# Altium schematic symbol library Analog Devices Operational Amplifiers.SchLib: 2102 symbols (part 7 of 35) (continued)
## AD8016ARBZ (continued)

## AD8016ARBZ-REEL
designator U?
Double Channel Low Power Operational Amplifier, 380 MHz BW, 1 KV/us SR, Industrial, 24-pin SOIC (RB-24), Reel; Generic Part Number: AD8016; Manufacturer: Analog Devices; PartNumber: AD8016ARBZ-REEL; Amplifiers Per Package: 2; Input Bias Current: 45uA; Input Offset Voltage: 1mV; Iq/Amp: 13.2mA; Slew Rate: 1KV/us; Small Signal Bandwidth: 380MHz; V Span Max: 26V; V Span Min: 6V; DatasheetVersion: 02-23-2012-A; PackageReference: RB-24; PackageDescription: 24-Pin Batwing SOIC, Thermally Enhanced with Fused Leads, Body 15.4 x 7.5 mm, Pitch 1.27 mm; Supplier 1: Digi-Key; Supplier Part Number 1: AD8016ARBZ-REEL-ND; Mounting Technology: Surface Mount; Code_JEDEC: MS-013-AD; ComponentLink1Description: Manufacturer URL; ComponentLink1URL: http://www.analog.com/en/index.html; ComponentLink2Description: Datasheet; ComponentLink2URL: http://www.analog.com/static/imported-files/data_sheets/AD8016.pdf; ComponentLink3Description: Package Specification; ComponentLink3URL: http://www.analog.com/static/imported-files/packages/479743993852630252966076RB_24.pdf
footprint ADI-RB-24_N (SOIC, 24-Leads, Body 15.4x7.5mm, Pitch 1.27mm, IPC Medium Density)
footprint ADI-RB-24_L (SOIC, 24-Leads, Body 15.4x7.5mm, Pitch 1.27mm, IPC High Density)
footprint ADI-RB-24_M (SOIC, 24-Leads, Body 15.4x7.5mm, Pitch 1.27mm, IPC Low Density)
pins: 1 +V1 (power) "Positive Power Supply, Amp 1.", 2 VOUT 1 (out) "Output Signal, Amp 1.", 3 VINN 1 (in) "Negative Input Signal, Amp 1.", 4 VINP 1 (in) "Positive Input Signal, Amp1.", 5 AGND (power) "Analog Ground.", 6 AGND (power) "Analog Ground.", 7 AGND (power) "Analog Ground.", 8 AGND (power) "Analog Ground.", 9 PWDN 0 (in) "Power-Down Input 0.", 10 DGND (power) "Digital Ground.", 11 -V1 (power) "Negative Power Supply, Amp1.", 12 NC "This pin is not connected internally", 13 NC "This pin is not connected internally", 14 -V2 (power) "-V Power Supply, Amp 2.", 15 BIAS (in) "Quiescent Current Adjust.", 16 PWDN 1 (in) "Power-Down Input 1.", 17 AGND (power) "Analog Ground.", 18 AGND (power) "Analog Ground.", 19 AGND (power) "Analog Ground.", 20 AGND (power) "Analog Ground.", 21 VINP 2 (in) "Positive Input Signal, Amp 2.", 22 VINN 2 (in) "Negative Input Signal, Amp 2.", 23 VOUT 2 (out) "Output Signal, Amp 2.", 24 +V2 (power) "Positive Power Supply, Amp 2."

## AD8017AR
designator U?
Double Channel Low Power Operational Amplifier, 160 MHz BW, 1.6 KV/us SR, Industrial, 8-pin SOIC (R-8), Tube; Generic Part Number: AD8017; Manufacturer: Analog Devices; PartNumber: AD8017AR; Amplifiers Per Package: 2; Input Bias Current: 160uA; Input Offset Voltage: 1.8mV; Iq/Amp: 7.7mA; Small Signal Bandwidth: 160MHz; V Span Max: 12V; V Span Min: 4.4V; DatasheetVersion: Rev. C; PackageVersion: 060506-A; PackageReference: R-8; PackageDescription: 8-Pin Standard Small Outline Package, Body 3.9 x 4.9 mm, Pitch 1.27 mm; Supplier 1: Digi-Key; Supplier Part Number 1: AD8017AR-ND; Slew Rate: 1.6KV/us; Mounting Technology: Surface Mount; Code_JEDEC: MS-012-AA; ComponentLink1Description: Manufacturer URL; ComponentLink1URL: http://www.analog.com/en/index.html; ComponentLink2Description: Datasheet; ComponentLink2URL: http://www.analog.com/static/imported-files/data_sheets/AD8017.pdf; ComponentLink3Description: Package Specification; ComponentLink3URL: http://www.analog.com/static/imported-files/packages/PKG_PDF/SOIC_Narrow%20(R)/R_8.pdf
footprint ADI-R-8_N (SOIC, 8-Leads, Body 4.9x3.9mm, Pitch 1.27mm, IPC Medium Density)
footprint ADI-R-8_L (SOIC, 8-Leads, Body 4.9x3.9mm, Pitch 1.27mm, IPC High Density)
footprint ADI-R-8_M (SOIC, 8-Leads, Body 4.9x3.9mm, Pitch 1.27mm, IPC Low Density)
pins on every part: 4 -VS (power), 8 +VS (power)
part A pins: 1 OUT 1 (out), 2 -IN 1 (in), 3 +IN 1 (in)
part B pins: 5 +IN 2 (in), 6 -IN 2 (in), 7 OUT 2 (out)

## AD8017AR-REEL
designator U?
Double Channel Low Power Operational Amplifier, 160 MHz BW, 1.6 KV/us SR, Industrial, 8-pin SOIC (R-8), Reel; Generic Part Number: AD8017; Manufacturer: Analog Devices; PartNumber: AD8017AR-REEL; Amplifiers Per Package: 2; Input Bias Current: 160uA; Input Offset Voltage: 1.8mV; Iq/Amp: 7.7mA; Small Signal Bandwidth: 160MHz; V Span Max: 12V; V Span Min: 4.4V; DatasheetVersion: Rev. C; PackageVersion: 060506-A; PackageReference: R-8; PackageDescription: 8-Pin Standard Small Outline Package, Body 3.9 x 4.9 mm, Pitch 1.27 mm; Supplier 1: Digi-Key; Supplier Part Number 1: AD8017AR-REEL-ND; Supplier 2: Newark; Supplier Part Number 2: 09B6360; Slew Rate: 1.6KV/us; Mounting Technology: Surface Mount; Code_JEDEC: MS-012-AA; ComponentLink1Description: Manufacturer URL; ComponentLink1URL: http://www.analog.com/en/index.html; ComponentLink2Description: Datasheet; ComponentLink2URL: http://www.analog.com/static/imported-files/data_sheets/AD8017.pdf; ComponentLink3Description: Package Specification; ComponentLink3URL: http://www.analog.com/static/imported-files/packages/PKG_PDF/SOIC_Narrow%20(R)/R_8.pdf
footprint ADI-R-8_N (SOIC, 8-Leads, Body 4.9x3.9mm, Pitch 1.27mm, IPC Medium Density)
footprint ADI-R-8_L (SOIC, 8-Leads, Body 4.9x3.9mm, Pitch 1.27mm, IPC High Density)
footprint ADI-R-8_M (SOIC, 8-Leads, Body 4.9x3.9mm, Pitch 1.27mm, IPC Low Density)
pins on every part: 4 -VS (power), 8 +VS (power)
part A pins: 1 OUT 1 (out), 2 -IN 1 (in), 3 +IN 1 (in)
part B pins: 5 +IN 2 (in), 6 -IN 2 (in), 7 OUT 2 (out)

## AD8017AR-REEL7
designator U?
Double Channel Low Power Operational Amplifier, 160 MHz BW, 1.6 KV/us SR, Industrial, 8-pin SOIC (R-8), Reel; Generic Part Number: AD8017; Manufacturer: Analog Devices; PartNumber: AD8017AR-REEL7; Amplifiers Per Package: 2; Input Bias Current: 160uA; Input Offset Voltage: 1.8mV; Iq/Amp: 7.7mA; Small Signal Bandwidth: 160MHz; V Span Max: 12V; V Span Min: 4.4V; DatasheetVersion: Rev. C; PackageVersion: 060506-A; PackageReference: R-8; PackageDescription: 8-Pin Standard Small Outline Package, Body 3.9 x 4.9 mm, Pitch 1.27 mm; Supplier 1: Digi-Key; Supplier Part Number 1: AD8017AR-REEL7-ND; Slew Rate: 1.6KV/us; Mounting Technology: Surface Mount; Code_JEDEC: MS-012-AA; ComponentLink1Description: Manufacturer URL; ComponentLink1URL: http://www.analog.com/en/index.html; ComponentLink2Description: Datasheet; ComponentLink2URL: http://www.analog.com/static/imported-files/data_sheets/AD8017.pdf; ComponentLink3Description: Package Specification; ComponentLink3URL: http://www.analog.com/static/imported-files/packages/PKG_PDF/SOIC_Narrow%20(R)/R_8.pdf
footprint ADI-R-8_N (SOIC, 8-Leads, Body 4.9x3.9mm, Pitch 1.27mm, IPC Medium Density)
footprint ADI-R-8_L (SOIC, 8-Leads, Body 4.9x3.9mm, Pitch 1.27mm, IPC High Density)
footprint ADI-R-8_M (SOIC, 8-Leads, Body 4.9x3.9mm, Pitch 1.27mm, IPC Low Density)
pins on every part: 4 -VS (power), 8 +VS (power)
part A pins: 1 OUT 1 (out), 2 -IN 1 (in), 3 +IN 1 (in)
part B pins: 5 +IN 2 (in), 6 -IN 2 (in), 7 OUT 2 (out)

## AD8017ARZ
designator U?
Double Channel Low Power Operational Amplifier, 160 MHz BW, 1.6 KV/us SR, Industrial, 8-pin SOIC (R-8), Tube; Generic Part Number: AD8017; Manufacturer: Analog Devices; PartNumber: AD8017ARZ; Amplifiers Per Package: 2; Input Bias Current: 160uA; Input Offset Voltage: 1.8mV; Iq/Amp: 7.7mA; Small Signal Bandwidth: 160MHz; V Span Max: 12V; V Span Min: 4.4V; DatasheetVersion: Rev. C; PackageVersion: 060506-A; PackageReference: R-8; PackageDescription: 8-Pin Standard Small Outline Package, Body 3.9 x 4.9 mm, Pitch 1.27 mm; Supplier 1: Digi-Key; Supplier Part Number 1: AD8017ARZ-ND; Supplier 2: Farnell; Supplier Part Number 2: 9425705; Supplier 3: Newark; Supplier Part Number 3: 31M4441; Supplier 4: Newark; Supplier Part Number 4: 82H2945; Slew Rate: 1.6KV/us; Mounting Technology: Surface Mount; Code_JEDEC: MS-012-AA; ComponentLink1Description: Manufacturer URL; ComponentLink1URL: http://www.analog.com/en/index.html; ComponentLink2Description: Datasheet; ComponentLink2URL: http://www.analog.com/static/imported-files/data_sheets/AD8017.pdf; ComponentLink3Description: Package Specification; ComponentLink3URL: http://www.analog.com/static/imported-files/packages/PKG_PDF/SOIC_Narrow%20(R)/R_8.pdf
footprint ADI-R-8_N (SOIC, 8-Leads, Body 4.9x3.9mm, Pitch 1.27mm, IPC Medium Density)
footprint ADI-R-8_L (SOIC, 8-Leads, Body 4.9x3.9mm, Pitch 1.27mm, IPC High Density)
footprint ADI-R-8_M (SOIC, 8-Leads, Body 4.9x3.9mm, Pitch 1.27mm, IPC Low Density)
pins on every part: 4 -VS (power), 8 +VS (power)
part A pins: 1 OUT 1 (out), 2 -IN 1 (in), 3 +IN 1 (in)
part B pins: 5 +IN 2 (in), 6 -IN 2 (in), 7 OUT 2 (out)

## AD8017ARZ-REEL
designator U?
Double Channel Low Power Operational Amplifier, 160 MHz BW, 1.6 KV/us SR, Industrial, 8-pin SOIC (R-8), Reel; Generic Part Number: AD8017; Manufacturer: Analog Devices; PartNumber: AD8017ARZ-REEL; Amplifiers Per Package: 2; Input Bias Current: 160uA; Input Offset Voltage: 1.8mV; Iq/Amp: 7.7mA; Small Signal Bandwidth: 160MHz; V Span Max: 12V; V Span Min: 4.4V; DatasheetVersion: Rev. C; PackageVersion: 060506-A; PackageReference: R-8; PackageDescription: 8-Pin Standard Small Outline Package, Body 3.9 x 4.9 mm, Pitch 1.27 mm; Supplier 1: Digi-Key; Supplier Part Number 1: AD8017ARZ-REEL-ND; Slew Rate: 1.6KV/us; Mounting Technology: Surface Mount; Code_JEDEC: MS-012-AA; ComponentLink1Description: Manufacturer URL; ComponentLink1URL: http://www.analog.com/en/index.html; ComponentLink2Description: Datasheet; ComponentLink2URL: http://www.analog.com/static/imported-files/data_sheets/AD8017.pdf; ComponentLink3Description: Package Specification; ComponentLink3URL: http://www.analog.com/static/imported-files/packages/PKG_PDF/SOIC_Narrow%20(R)/R_8.pdf
footprint ADI-R-8_N (SOIC, 8-Leads, Body 4.9x3.9mm, Pitch 1.27mm, IPC Medium Density)
footprint ADI-R-8_L (SOIC, 8-Leads, Body 4.9x3.9mm, Pitch 1.27mm, IPC High Density)
footprint ADI-R-8_M (SOIC, 8-Leads, Body 4.9x3.9mm, Pitch 1.27mm, IPC Low Density)
pins on every part: 4 -VS (power), 8 +VS (power)
part A pins: 1 OUT 1 (out), 2 -IN 1 (in), 3 +IN 1 (in)
part B pins: 5 +IN 2 (in), 6 -IN 2 (in), 7 OUT 2 (out)

## AD8017ARZ-REEL7
designator U?
Double Channel Low Power Operational Amplifier, 160 MHz BW, 1.6 KV/us SR, Industrial, 8-pin SOIC (R-8), Reel; Generic Part Number: AD8017; Manufacturer: Analog Devices; PartNumber: AD8017ARZ-REEL7; Amplifiers Per Package: 2; Input Bias Current: 160uA; Input Offset Voltage: 1.8mV; Iq/Amp: 7.7mA; Small Signal Bandwidth: 160MHz; V Span Max: 12V; V Span Min: 4.4V; DatasheetVersion: Rev. C; PackageVersion: 060506-A; PackageReference: R-8; PackageDescription: 8-Pin Standard Small Outline Package, Body 3.9 x 4.9 mm, Pitch 1.27 mm; Supplier 1: Digi-Key; Supplier Part Number 1: AD8017ARZ-REEL7TR-ND; Supplier 2: Digi-Key; Supplier Part Number 2: AD8017ARZ-REEL7CT-ND; Supplier 3: Digi-Key; Supplier Part Number 3: AD8017ARZ-REEL7DKR-ND; Slew Rate: 1.6KV/us; Mounting Technology: Surface Mount; Code_JEDEC: MS-012-AA; ComponentLink1Description: Manufacturer URL; ComponentLink1URL: http://www.analog.com/en/index.html; ComponentLink2Description: Datasheet; ComponentLink2URL: http://www.analog.com/static/imported-files/data_sheets/AD8017.pdf; ComponentLink3Description: Package Specification; ComponentLink3URL: http://www.analog.com/static/imported-files/packages/PKG_PDF/SOIC_Narrow%20(R)/R_8.pdf
footprint ADI-R-8_N (SOIC, 8-Leads, Body 4.9x3.9mm, Pitch 1.27mm, IPC Medium Density)
footprint ADI-R-8_L (SOIC, 8-Leads, Body 4.9x3.9mm, Pitch 1.27mm, IPC High Density)
footprint ADI-R-8_M (SOIC, 8-Leads, Body 4.9x3.9mm, Pitch 1.27mm, IPC Low Density)
pins on every part: 4 -VS (power), 8 +VS (power)
part A pins: 1 OUT 1 (out), 2 -IN 1 (in), 3 +IN 1 (in)
part B pins: 5 +IN 2 (in), 6 -IN 2 (in), 7 OUT 2 (out)

## AD8018AR-REEL7
designator U?
Double Channel Rail-to-Rail Operational Amplifier, 130 MHz BW, 300 V/us SR, Industrial, 8-pin SOIC (R-8), Reel; Generic Part Number: AD8018; Manufacturer: Analog Devices; PartNumber: AD8018AR-REEL7; Amplifiers Per Package: 2; Input Bias Current: 1uA; Input Offset Voltage: 1mV; Iq/Amp: 10mA; Small Signal Bandwidth: 130MHz; V Span Max: 8V; V Span Min: 3.3V; DatasheetVersion: Rev. A; PackageVersion: 060506-A; PackageReference: R-8; PackageDescription: 8-Pin Standard Small Outline Package, Body 3.9 x 4.9 mm, Pitch 1.27 mm; Supplier 1: Digi-Key; Supplier Part Number 1: AD8018AR-REEL7TR-ND; Supplier 2: Digi-Key; Supplier Part Number 2: AD8018AR-REEL7CT-ND; Supplier 3: Digi-Key; Supplier Part Number 3: AD8018AR-REEL7DKR-ND; Slew Rate: 300V/us; Mounting Technology: Surface Mount; Code_JEDEC: MS-012-AA; ComponentLink1Description: Manufacturer URL; ComponentLink1URL: http://www.analog.com/en/index.html; ComponentLink2Description: Datasheet; ComponentLink2URL: http://www.analog.com/static/imported-files/data_sheets/AD8018.pdf; ComponentLink3Description: Package Specification; ComponentLink3URL: http://www.analog.com/static/imported-files/packages/PKG_PDF/SOIC_Narrow%20(R)/R_8.pdf
footprint ADI-R-8_N (SOIC, 8-Leads, Body 4.9x3.9mm, Pitch 1.27mm, IPC Medium Density)
footprint ADI-R-8_L (SOIC, 8-Leads, Body 4.9x3.9mm, Pitch 1.27mm, IPC High Density)
footprint ADI-R-8_M (SOIC, 8-Leads, Body 4.9x3.9mm, Pitch 1.27mm, IPC Low Density)
pins on every part: 4 -VS (power), 8 +VS (power)
part A pins: 1 OUT 1 (out), 2 -IN 1 (in), 3 +IN 1 (in)
part B pins: 5 +IN 2 (in), 6 -IN 2 (in), 7 OUT 2 (out)

## AD8018ARUZ
designator U?
Double Channel Rail-to-Rail Operational Amplifier, 130 MHz BW, 300 V/us SR, Industrial, 14-pin SOP (RU-14), Tube; Generic Part Number: AD8018; Manufacturer: Analog Devices; PartNumber: AD8018ARUZ; Amplifiers Per Package: 2; Input Bias Current: 1uA; Input Offset Voltage: 1mV; Iq/Amp: 10mA; Small Signal Bandwidth: 130MHz; V Span Max: 8V; V Span Min: 3.3V; DatasheetVersion: Rev. A; PackageReference: RU-14; PackageDescription: 14-Pin Thin Shrink Small Outline Package, Body 5 x 4.4 mm, Pitch 0.65 mm; Supplier 1: Digi-Key; Supplier Part Number 1: AD8018ARUZ-ND; Supplier 2: Farnell; Supplier Part Number 2: 1899407; Supplier 3: Newark; Supplier Part Number 3: 59K6188; Slew Rate: 300V/us; Mounting Technology: Surface Mount; Code_JEDEC: MO-153AB-1; ComponentLink1Description: Manufacturer URL; ComponentLink1URL: http://www.analog.com/en/index.html; ComponentLink2Description: Datasheet; ComponentLink2URL: http://www.analog.com/static/imported-files/data_sheets/AD8018.pdf; ComponentLink3Description: Package Specification; ComponentLink3URL: http://www.analog.com/static/imported-files/packages/36057385283879153717235186773RU14.pdf
footprint ADI-RU-14_N (SOP, 14-Leads, Body 5x4.4mm, Pitch 0.65mm, IPC Medium Density)
footprint ADI-RU-14_L (SOP, 14-Leads, Body 5x4.4mm, Pitch 0.65mm, IPC High Density)
footprint ADI-RU-14_M (SOP, 14-Leads, Body 5x4.4mm, Pitch 0.65mm, IPC Low Density)
part A pins: 2 OUT 1 (hiz), 3 -IN 1 (in), 4 +IN 1 (in)
part B pins: 10 +IN 2 (in), 11 -IN 2 (in), 12 OUT 2 (hiz)
part C pins: 1 NC, 5 -VS (power), 6 PWDN 1 (in), 7 NC, 8 DGND (power), 9 PWDN 0 (in), 13 +VS (power), 14 NC

## AD8018ARUZ-REEL
designator U?
Double Channel Rail-to-Rail Operational Amplifier, 130 MHz BW, 300 V/us SR, Industrial, 14-pin SOP (RU-14), Reel; Generic Part Number: AD8018; Manufacturer: Analog Devices; PartNumber: AD8018ARUZ-REEL; Amplifiers Per Package: 2; Input Bias Current: 1uA; Input Offset Voltage: 1mV; Iq/Amp: 10mA; Small Signal Bandwidth: 130MHz; V Span Max: 8V; V Span Min: 3.3V; DatasheetVersion: Rev. A; PackageReference: RU-14; PackageDescription: 14-Pin Thin Shrink Small Outline Package, Body 5 x 4.4 mm, Pitch 0.65 mm; Supplier 1: Digi-Key; Supplier Part Number 1: AD8018ARUZ-REEL-ND; Slew Rate: 300V/us; Mounting Technology: Surface Mount; Code_JEDEC: MO-153AB-1; ComponentLink1Description: Manufacturer URL; ComponentLink1URL: http://www.analog.com/en/index.html; ComponentLink2Description: Datasheet; ComponentLink2URL: http://www.analog.com/static/imported-files/data_sheets/AD8018.pdf; ComponentLink3Description: Package Specification; ComponentLink3URL: http://www.analog.com/static/imported-files/packages/36057385283879153717235186773RU14.pdf
footprint ADI-RU-14_N (SOP, 14-Leads, Body 5x4.4mm, Pitch 0.65mm, IPC Medium Density)
footprint ADI-RU-14_L (SOP, 14-Leads, Body 5x4.4mm, Pitch 0.65mm, IPC High Density)
footprint ADI-RU-14_M (SOP, 14-Leads, Body 5x4.4mm, Pitch 0.65mm, IPC Low Density)
part A pins: 2 OUT 1 (hiz), 3 -IN 1 (in), 4 +IN 1 (in)
part B pins: 10 +IN 2 (in), 11 -IN 2 (in), 12 OUT 2 (hiz)
part C pins: 1 NC, 5 -VS (power), 6 PWDN 1 (in), 7 NC, 8 DGND (power), 9 PWDN 0 (in), 13 +VS (power), 14 NC

## AD8018ARUZ-REEL7
designator U?
Double Channel Rail-to-Rail Operational Amplifier, 130 MHz BW, 300 V/us SR, Industrial, 14-pin SOP (RU-14), Reel; Generic Part Number: AD8018; Manufacturer: Analog Devices; PartNumber: AD8018ARUZ-REEL7; Amplifiers Per Package: 2; Input Bias Current: 1uA; Input Offset Voltage: 1mV; Iq/Amp: 10mA; Small Signal Bandwidth: 130MHz; V Span Max: 8V; V Span Min: 3.3V; DatasheetVersion: Rev. A; PackageReference: RU-14; PackageDescription: 14-Pin Thin Shrink Small Outline Package, Body 5 x 4.4 mm, Pitch 0.65 mm; Supplier 1: Digi-Key; Supplier Part Number 1: AD8018ARUZ-REEL7-ND; Slew Rate: 300V/us; Mounting Technology: Surface Mount; Code_JEDEC: MO-153AB-1; ComponentLink1Description: Manufacturer URL; ComponentLink1URL: http://www.analog.com/en/index.html; ComponentLink2Description: Datasheet; ComponentLink2URL: http://www.analog.com/static/imported-files/data_sheets/AD8018.pdf; ComponentLink3Description: Package Specification; ComponentLink3URL: http://www.analog.com/static/imported-files/packages/36057385283879153717235186773RU14.pdf
footprint ADI-RU-14_N (SOP, 14-Leads, Body 5x4.4mm, Pitch 0.65mm, IPC Medium Density)
footprint ADI-RU-14_L (SOP, 14-Leads, Body 5x4.4mm, Pitch 0.65mm, IPC High Density)
footprint ADI-RU-14_M (SOP, 14-Leads, Body 5x4.4mm, Pitch 0.65mm, IPC Low Density)
part A pins: 2 OUT 1 (hiz), 3 -IN 1 (in), 4 +IN 1 (in)
part B pins: 10 +IN 2 (in), 11 -IN 2 (in), 12 OUT 2 (hiz)
part C pins: 1 NC, 5 -VS (power), 6 PWDN 1 (in), 7 NC, 8 DGND (power), 9 PWDN 0 (in), 13 +VS (power), 14 NC

## AD8018ARZ
designator U?
Double Channel Rail-to-Rail Operational Amplifier, 130 MHz BW, 300 V/us SR, Industrial, 8-pin SOIC (R-8), Tube; Generic Part Number: AD8018; Manufacturer: Analog Devices; PartNumber: AD8018ARZ; Amplifiers Per Package: 2; Input Bias Current: 1uA; Input Offset Voltage: 1mV; Iq/Amp: 10mA; Small Signal Bandwidth: 130MHz; V Span Max: 8V; V Span Min: 3.3V; DatasheetVersion: Rev. A; PackageVersion: 060506-A; PackageReference: R-8; PackageDescription: 8-Pin Standard Small Outline Package, Body 3.9 x 4.9 mm, Pitch 1.27 mm; Supplier 1: Digi-Key; Supplier Part Number 1: AD8018ARZ-ND; Supplier 2: Newark; Supplier Part Number 2: 59K6191; Slew Rate: 300V/us; Mounting Technology: Surface Mount; Code_JEDEC: MS-012-AA; ComponentLink1Description: Manufacturer URL; ComponentLink1URL: http://www.analog.com/en/index.html; ComponentLink2Description: Datasheet; ComponentLink2URL: http://www.analog.com/static/imported-files/data_sheets/AD8018.pdf; ComponentLink3Description: Package Specification; ComponentLink3URL: http://www.analog.com/static/imported-files/packages/PKG_PDF/SOIC_Narrow%20(R)/R_8.pdf
footprint ADI-R-8_N (SOIC, 8-Leads, Body 4.9x3.9mm, Pitch 1.27mm, IPC Medium Density)
footprint ADI-R-8_L (SOIC, 8-Leads, Body 4.9x3.9mm, Pitch 1.27mm, IPC High Density)
footprint ADI-R-8_M (SOIC, 8-Leads, Body 4.9x3.9mm, Pitch 1.27mm, IPC Low Density)
pins on every part: 4 -VS (power), 8 +VS (power)
part A pins: 1 OUT 1 (out), 2 -IN 1 (in), 3 +IN 1 (in)
part B pins: 5 +IN 2 (in), 6 -IN 2 (in), 7 OUT 2 (out)

## AD8018ARZ-REEL
designator U?
Double Channel Rail-to-Rail Operational Amplifier, 130 MHz BW, 300 V/us SR, Industrial, 8-pin SOIC (R-8), Reel; Generic Part Number: AD8018; Manufacturer: Analog Devices; PartNumber: AD8018ARZ-REEL; Amplifiers Per Package: 2; Input Bias Current: 1uA; Input Offset Voltage: 1mV; Iq/Amp: 10mA; Small Signal Bandwidth: 130MHz; V Span Max: 8V; V Span Min: 3.3V; DatasheetVersion: Rev. A; PackageVersion: 060506-A; PackageReference: R-8; PackageDescription: 8-Pin Standard Small Outline Package, Body 3.9 x 4.9 mm, Pitch 1.27 mm; Supplier 1: Digi-Key; Supplier Part Number 1: AD8018ARZ-REEL-ND; Slew Rate: 300V/us; Mounting Technology: Surface Mount; Code_JEDEC: MS-012-AA; ComponentLink1Description: Manufacturer URL; ComponentLink1URL: http://www.analog.com/en/index.html; ComponentLink2Description: Datasheet; ComponentLink2URL: http://www.analog.com/static/imported-files/data_sheets/AD8018.pdf; ComponentLink3Description: Package Specification; ComponentLink3URL: http://www.analog.com/static/imported-files/packages/PKG_PDF/SOIC_Narrow%20(R)/R_8.pdf
footprint ADI-R-8_N (SOIC, 8-Leads, Body 4.9x3.9mm, Pitch 1.27mm, IPC Medium Density)
footprint ADI-R-8_L (SOIC, 8-Leads, Body 4.9x3.9mm, Pitch 1.27mm, IPC High Density)
footprint ADI-R-8_M (SOIC, 8-Leads, Body 4.9x3.9mm, Pitch 1.27mm, IPC Low Density)
pins on every part: 4 -VS (power), 8 +VS (power)
part A pins: 1 OUT 1 (out), 2 -IN 1 (in), 3 +IN 1 (in)
part B pins: 5 +IN 2 (in), 6 -IN 2 (in), 7 OUT 2 (out)

## AD8018ARZ-REEL7
designator U?
Double Channel Rail-to-Rail Operational Amplifier, 130 MHz BW, 300 V/us SR, Industrial, 8-pin SOIC (R-8), Reel; Generic Part Number: AD8018; Manufacturer: Analog Devices; PartNumber: AD8018ARZ-REEL7; Amplifiers Per Package: 2; Input Bias Current: 1uA; Input Offset Voltage: 1mV; Iq/Amp: 10mA; Small Signal Bandwidth: 130MHz; V Span Max: 8V; V Span Min: 3.3V; DatasheetVersion: Rev. A; PackageVersion: 060506-A; PackageReference: R-8; PackageDescription: 8-Pin Standard Small Outline Package, Body 3.9 x 4.9 mm, Pitch 1.27 mm; Supplier 1: Digi-Key; Supplier Part Number 1: AD8018ARZ-REEL7-ND; Slew Rate: 300V/us; Mounting Technology: Surface Mount; Code_JEDEC: MS-012-AA; ComponentLink1Description: Manufacturer URL; ComponentLink1URL: http://www.analog.com/en/index.html; ComponentLink2Description: Datasheet; ComponentLink2URL: http://www.analog.com/static/imported-files/data_sheets/AD8018.pdf; ComponentLink3Description: Package Specification; ComponentLink3URL: http://www.analog.com/static/imported-files/packages/PKG_PDF/SOIC_Narrow%20(R)/R_8.pdf
footprint ADI-R-8_N (SOIC, 8-Leads, Body 4.9x3.9mm, Pitch 1.27mm, IPC Medium Density)
footprint ADI-R-8_L (SOIC, 8-Leads, Body 4.9x3.9mm, Pitch 1.27mm, IPC High Density)
footprint ADI-R-8_M (SOIC, 8-Leads, Body 4.9x3.9mm, Pitch 1.27mm, IPC Low Density)
pins on every part: 4 -VS (power), 8 +VS (power)
part A pins: 1 OUT 1 (out), 2 -IN 1 (in), 3 +IN 1 (in)
part B pins: 5 +IN 2 (in), 6 -IN 2 (in), 7 OUT 2 (out)

## AD8021AR
designator U?
Single Channel Low Power Operational Amplifier, 490 MHz BW, 120 V/us SR, Industrial, 8-pin SOIC (R-8), Tube; Generic Part Number: AD8021; Manufacturer: Analog Devices; PartNumber: AD8021AR; Amplifiers Per Package: 1; Input Bias Current: 7.5uA; Input Offset Voltage: 400uV; Iq/Amp: 7.7mA; Small Signal Bandwidth: 490MHz; V Span Max: 24V; V Span Min: 4.5V; DatasheetVersion: Rev. F; PackageVersion: 060506-A; PackageReference: R-8; PackageDescription: 8-Pin Standard Small Outline Package, Body 3.9 x 4.9 mm, Pitch 1.27 mm; Supplier 1: Digi-Key; Supplier Part Number 1: AD8021AR-ND; Slew Rate: 120V/us; Mounting Technology: Surface Mount; Code_JEDEC: MS-012-AA; ComponentLink1Description: Manufacturer URL; ComponentLink1URL: http://www.analog.com/en/index.html; ComponentLink2Description: Datasheet; ComponentLink2URL: http://www.analog.com/static/imported-files/data_sheets/AD8021.pdf; ComponentLink3Description: Package Specification; ComponentLink3URL: http://www.analog.com/static/imported-files/packages/PKG_PDF/SOIC_Narrow%20(R)/R_8.pdf; ComponentLink4Description: Reference Circuit; ComponentLink4URL: http://www.analog.com/en/all-operational-amplifiers-op-amps/operational-amplifiers-op-amps/ad8021/products/product.html#product-recommendations
footprint ADI-R-8_N (SOIC, 8-Leads, Body 4.9x3.9mm, Pitch 1.27mm, IPC Medium Density)
footprint ADI-R-8_L (SOIC, 8-Leads, Body 4.9x3.9mm, Pitch 1.27mm, IPC High Density)
footprint ADI-R-8_M (SOIC, 8-Leads, Body 4.9x3.9mm, Pitch 1.27mm, IPC Low Density)
pins: 1 LOGIC REFERENCE "Reference for Pin 81 Voltage Level. Connect to logic low supply.", 2 -IN (in) "Inverting Input.", 3 +IN (in) "Noninverting Input.", 4 -VS (power) "Negative Supply Voltage.", 5 CCOMP "Compensation Capacitor. Tie to -VS. (See the Applications section for value.)", 6 VOUT (out) "Output.", 7 +VS (power) "Positive Supply Voltage.", 8 ~{DISABLE} (in) "Disable, Active Low."

## AD8021AR-REEL
designator U?
Single Channel Low Power Operational Amplifier, 490 MHz BW, 120 V/us SR, Industrial, 8-pin SOIC (R-8), Reel; Generic Part Number: AD8021; Manufacturer: Analog Devices; PartNumber: AD8021AR-REEL; Amplifiers Per Package: 1; Input Bias Current: 7.5uA; Input Offset Voltage: 400uV; Iq/Amp: 7.7mA; Small Signal Bandwidth: 490MHz; V Span Max: 24V; V Span Min: 4.5V; DatasheetVersion: Rev. F; PackageVersion: 060506-A; PackageReference: R-8; PackageDescription: 8-Pin Standard Small Outline Package, Body 3.9 x 4.9 mm, Pitch 1.27 mm; Supplier 1: Digi-Key; Supplier Part Number 1: AD8021AR-REEL-ND; Supplier 2: Newark; Supplier Part Number 2: 02H1803; Slew Rate: 120V/us; Mounting Technology: Surface Mount; Code_JEDEC: MS-012-AA; ComponentLink1Description: Manufacturer URL; ComponentLink1URL: http://www.analog.com/en/index.html; ComponentLink2Description: Datasheet; ComponentLink2URL: http://www.analog.com/static/imported-files/data_sheets/AD8021.pdf; ComponentLink3Description: Package Specification; ComponentLink3URL: http://www.analog.com/static/imported-files/packages/PKG_PDF/SOIC_Narrow%20(R)/R_8.pdf; ComponentLink4Description: Reference Circuit; ComponentLink4URL: http://www.analog.com/en/all-operational-amplifiers-op-amps/operational-amplifiers-op-amps/ad8021/products/product.html#product-recommendations
footprint ADI-R-8_N (SOIC, 8-Leads, Body 4.9x3.9mm, Pitch 1.27mm, IPC Medium Density)
footprint ADI-R-8_L (SOIC, 8-Leads, Body 4.9x3.9mm, Pitch 1.27mm, IPC High Density)
footprint ADI-R-8_M (SOIC, 8-Leads, Body 4.9x3.9mm, Pitch 1.27mm, IPC Low Density)
pins: 1 LOGIC REFERENCE "Reference for Pin 81 Voltage Level. Connect to logic low supply.", 2 -IN (in) "Inverting Input.", 3 +IN (in) "Noninverting Input.", 4 -VS (power) "Negative Supply Voltage.", 5 CCOMP "Compensation Capacitor. Tie to -VS. (See the Applications section for value.)", 6 VOUT (out) "Output.", 7 +VS (power) "Positive Supply Voltage.", 8 ~{DISABLE} (in) "Disable, Active Low."

## AD8021AR-REEL7
designator U?
Single Channel Low Power Operational Amplifier, 490 MHz BW, 120 V/us SR, Industrial, 8-pin SOIC (R-8), Reel; Generic Part Number: AD8021; Manufacturer: Analog Devices; PartNumber: AD8021AR-REEL7; Amplifiers Per Package: 1; Input Bias Current: 7.5uA; Input Offset Voltage: 400uV; Iq/Amp: 7.7mA; Small Signal Bandwidth: 490MHz; V Span Max: 24V; V Span Min: 4.5V; DatasheetVersion: Rev. F; PackageVersion: 060506-A; PackageReference: R-8; PackageDescription: 8-Pin Standard Small Outline Package, Body 3.9 x 4.9 mm, Pitch 1.27 mm; Supplier 1: Digi-Key; Supplier Part Number 1: AD8021AR-REEL7-ND; Supplier 2: Newark; Supplier Part Number 2: 02H1804; Slew Rate: 120V/us; Mounting Technology: Surface Mount; Code_JEDEC: MS-012-AA; ComponentLink1Description: Manufacturer URL; ComponentLink1URL: http://www.analog.com/en/index.html; ComponentLink2Description: Datasheet; ComponentLink2URL: http://www.analog.com/static/imported-files/data_sheets/AD8021.pdf; ComponentLink3Description: Package Specification; ComponentLink3URL: http://www.analog.com/static/imported-files/packages/PKG_PDF/SOIC_Narrow%20(R)/R_8.pdf; ComponentLink4Description: Reference Circuit; ComponentLink4URL: http://www.analog.com/en/all-operational-amplifiers-op-amps/operational-amplifiers-op-amps/ad8021/products/product.html#product-recommendations
footprint ADI-R-8_N (SOIC, 8-Leads, Body 4.9x3.9mm, Pitch 1.27mm, IPC Medium Density)
footprint ADI-R-8_L (SOIC, 8-Leads, Body 4.9x3.9mm, Pitch 1.27mm, IPC High Density)
footprint ADI-R-8_M (SOIC, 8-Leads, Body 4.9x3.9mm, Pitch 1.27mm, IPC Low Density)
pins: 1 LOGIC REFERENCE "Reference for Pin 81 Voltage Level. Connect to logic low supply.", 2 -IN (in) "Inverting Input.", 3 +IN (in) "Noninverting Input.", 4 -VS (power) "Negative Supply Voltage.", 5 CCOMP "Compensation Capacitor. Tie to -VS. (See the Applications section for value.)", 6 VOUT (out) "Output.", 7 +VS (power) "Positive Supply Voltage.", 8 ~{DISABLE} (in) "Disable, Active Low."

## AD8021ARM
designator U?
Single Channel Low Power Operational Amplifier, 490 MHz BW, 120 V/us SR, Industrial, 8-pin SOP (RM-8), Tube; Generic Part Number: AD8021; Manufacturer: Analog Devices; PartNumber: AD8021ARM; Amplifiers Per Package: 1; Input Bias Current: 7.5uA; Input Offset Voltage: 400uV; Iq/Amp: 7.7mA; Small Signal Bandwidth: 490MHz; V Span Max: 24V; V Span Min: 4.5V; DatasheetVersion: Rev. F; PackageReference: RM-8; PackageDescription: 8-Pin Mini Small Outline Package, Body 3 x 3 mm, Pitch 0.65 mm; Supplier 1: Digi-Key; Supplier Part Number 1: AD8021ARM-ND; Slew Rate: 120V/us; Mounting Technology: Surface Mount; Code_JEDEC: MO-187-AA; ComponentLink1Description: Manufacturer URL; ComponentLink1URL: http://www.analog.com/en/index.html; ComponentLink2Description: Datasheet; ComponentLink2URL: http://www.analog.com/static/imported-files/data_sheets/AD8021.pdf; ComponentLink3Description: Package Specification; ComponentLink3URL: http://www.analog.com/static/imported-files/packages/PKG_PDF/MSOP%28RM%29/RM_8.pdf; ComponentLink4Description: Reference Circuit; ComponentLink4URL: http://www.analog.com/en/all-operational-amplifiers-op-amps/operational-amplifiers-op-amps/ad8021/products/product.html#product-recommendations
footprint ADI-RM-8_N (SOP, 8-Leads, Body 3x3mm, Pitch 0.65mm, IPC Medium Density)
footprint ADI-RM-8_L (SOP, 8-Leads, Body 3x3mm, Pitch 0.65mm, IPC High Density)
footprint ADI-RM-8_M (SOP, 8-Leads, Body 3x3mm, Pitch 0.65mm, IPC Low Density)
pins: 1 LOGIC REFERENCE "Reference for Pin 8 Voltage Level. Connect to logic low supply.", 2 -IN (in) "Inverting Input.", 3 +IN (in) "Noninverting Input.", 4 -VS (power) "Negative Supply Voltage.", 5 CCOMP "Compensation Capacitor. Tie to -VS. (See the Applications section for value.)", 6 VOUT (hiz) "Output.", 7 +VS (power) "Positive Supply Voltage.", 8 ~{DISABLE} (in) "Disable, Active Low."

## AD8021ARM-REEL
designator U?
Single Channel Low Power Operational Amplifier, 490 MHz BW, 120 V/us SR, Industrial, 8-pin SOP (RM-8), Reel; Generic Part Number: AD8021; Manufacturer: Analog Devices; PartNumber: AD8021ARM-REEL; Amplifiers Per Package: 1; Input Bias Current: 7.5uA; Input Offset Voltage: 400uV; Iq/Amp: 7.7mA; Small Signal Bandwidth: 490MHz; V Span Max: 24V; V Span Min: 4.5V; DatasheetVersion: Rev. F; PackageReference: RM-8; PackageDescription: 8-Pin Mini Small Outline Package, Body 3 x 3 mm, Pitch 0.65 mm; Supplier 1: Digi-Key; Supplier Part Number 1: AD8021ARM-REEL-ND; Supplier 2: Newark; Supplier Part Number 2: 02H1806; Slew Rate: 120V/us; Mounting Technology: Surface Mount; Code_JEDEC: MO-187-AA; ComponentLink1Description: Manufacturer URL; ComponentLink1URL: http://www.analog.com/en/index.html; ComponentLink2Description: Datasheet; ComponentLink2URL: http://www.analog.com/static/imported-files/data_sheets/AD8021.pdf; ComponentLink3Description: Package Specification; ComponentLink3URL: http://www.analog.com/static/imported-files/packages/PKG_PDF/MSOP%28RM%29/RM_8.pdf; ComponentLink4Description: Reference Circuit; ComponentLink4URL: http://www.analog.com/en/all-operational-amplifiers-op-amps/operational-amplifiers-op-amps/ad8021/products/product.html#product-recommendations
footprint ADI-RM-8_N (SOP, 8-Leads, Body 3x3mm, Pitch 0.65mm, IPC Medium Density)
footprint ADI-RM-8_L (SOP, 8-Leads, Body 3x3mm, Pitch 0.65mm, IPC High Density)
footprint ADI-RM-8_M (SOP, 8-Leads, Body 3x3mm, Pitch 0.65mm, IPC Low Density)
pins: 1 LOGIC REFERENCE "Reference for Pin 8 Voltage Level. Connect to logic low supply.", 2 -IN (in) "Inverting Input.", 3 +IN (in) "Noninverting Input.", 4 -VS (power) "Negative Supply Voltage.", 5 CCOMP "Compensation Capacitor. Tie to -VS. (See the Applications section for value.)", 6 VOUT (hiz) "Output.", 7 +VS (power) "Positive Supply Voltage.", 8 ~{DISABLE} (in) "Disable, Active Low."

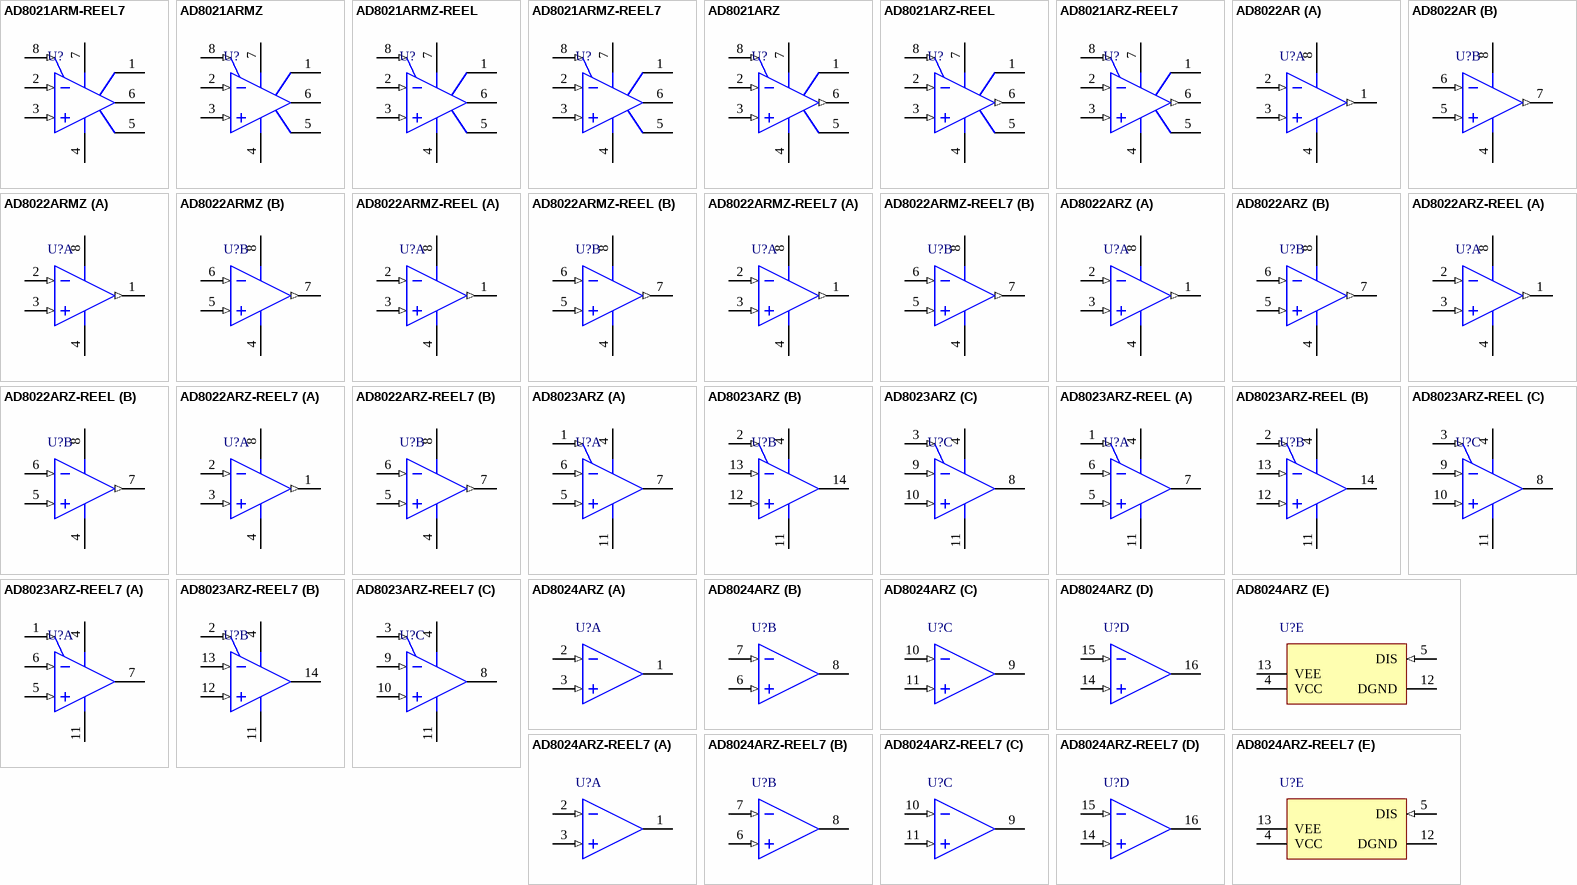
[diagram p21: symbols AD8021ARM-REEL7 to AD8024ARZ-REEL7]

## AD8021ARM-REEL7
designator U?
Single Channel Low Power Operational Amplifier, 490 MHz BW, 120 V/us SR, Industrial, 8-pin SOP (RM-8), Reel; Generic Part Number: AD8021; Manufacturer: Analog Devices; PartNumber: AD8021ARM-REEL7; Amplifiers Per Package: 1; Input Bias Current: 7.5uA; Input Offset Voltage: 400uV; Iq/Amp: 7.7mA; Small Signal Bandwidth: 490MHz; V Span Max: 24V; V Span Min: 4.5V; DatasheetVersion: Rev. F; PackageReference: RM-8; PackageDescription: 8-Pin Mini Small Outline Package, Body 3 x 3 mm, Pitch 0.65 mm; Supplier 1: Digi-Key; Supplier Part Number 1: AD8021ARM-REEL7-ND; Supplier 2: Newark; Supplier Part Number 2: 02H1807; Slew Rate: 120V/us; Mounting Technology: Surface Mount; Code_JEDEC: MO-187-AA; ComponentLink1Description: Manufacturer URL; ComponentLink1URL: http://www.analog.com/en/index.html; ComponentLink2Description: Datasheet; ComponentLink2URL: http://www.analog.com/static/imported-files/data_sheets/AD8021.pdf; ComponentLink3Description: Package Specification; ComponentLink3URL: http://www.analog.com/static/imported-files/packages/PKG_PDF/MSOP%28RM%29/RM_8.pdf; ComponentLink4Description: Reference Circuit; ComponentLink4URL: http://www.analog.com/en/all-operational-amplifiers-op-amps/operational-amplifiers-op-amps/ad8021/products/product.html#product-recommendations
footprint ADI-RM-8_N (SOP, 8-Leads, Body 3x3mm, Pitch 0.65mm, IPC Medium Density)
footprint ADI-RM-8_L (SOP, 8-Leads, Body 3x3mm, Pitch 0.65mm, IPC High Density)
footprint ADI-RM-8_M (SOP, 8-Leads, Body 3x3mm, Pitch 0.65mm, IPC Low Density)
pins: 1 LOGIC REFERENCE "Reference for Pin 8 Voltage Level. Connect to logic low supply.", 2 -IN (in) "Inverting Input.", 3 +IN (in) "Noninverting Input.", 4 -VS (power) "Negative Supply Voltage.", 5 CCOMP "Compensation Capacitor. Tie to -VS. (See the Applications section for value.)", 6 VOUT (hiz) "Output.", 7 +VS (power) "Positive Supply Voltage.", 8 ~{DISABLE} (in) "Disable, Active Low."

## AD8021ARMZ
designator U?
Single Channel Low Power Operational Amplifier, 490 MHz BW, 120 V/us SR, Industrial, 8-pin SOP (RM-8), Tube; Generic Part Number: AD8021; Manufacturer: Analog Devices; PartNumber: AD8021ARMZ; Amplifiers Per Package: 1; Input Bias Current: 7.5uA; Input Offset Voltage: 400uV; Iq/Amp: 7.7mA; Small Signal Bandwidth: 490MHz; V Span Max: 24V; V Span Min: 4.5V; DatasheetVersion: Rev. F; PackageReference: RM-8; PackageDescription: 8-Pin Mini Small Outline Package, Body 3 x 3 mm, Pitch 0.65 mm; Supplier 1: Digi-Key; Supplier Part Number 1: AD8021ARMZ-ND; Supplier 2: Farnell; Supplier Part Number 2: 1651289; Supplier 3: Newark; Supplier Part Number 3: 19M8871; Slew Rate: 120V/us; Mounting Technology: Surface Mount; Code_JEDEC: MO-187-AA; ComponentLink1Description: Manufacturer URL; ComponentLink1URL: http://www.analog.com/en/index.html; ComponentLink2Description: Datasheet; ComponentLink2URL: http://www.analog.com/static/imported-files/data_sheets/AD8021.pdf; ComponentLink3Description: Package Specification; ComponentLink3URL: http://www.analog.com/static/imported-files/packages/PKG_PDF/MSOP%28RM%29/RM_8.pdf; ComponentLink4Description: Reference Circuit; ComponentLink4URL: http://www.analog.com/en/all-operational-amplifiers-op-amps/operational-amplifiers-op-amps/ad8021/products/product.html#product-recommendations
footprint ADI-RM-8_N (SOP, 8-Leads, Body 3x3mm, Pitch 0.65mm, IPC Medium Density)
footprint ADI-RM-8_L (SOP, 8-Leads, Body 3x3mm, Pitch 0.65mm, IPC High Density)
footprint ADI-RM-8_M (SOP, 8-Leads, Body 3x3mm, Pitch 0.65mm, IPC Low Density)
pins: 1 LOGIC REFERENCE "Reference for Pin 8 Voltage Level. Connect to logic low supply.", 2 -IN (in) "Inverting Input.", 3 +IN (in) "Noninverting Input.", 4 -VS (power) "Negative Supply Voltage.", 5 CCOMP "Compensation Capacitor. Tie to -VS. (See the Applications section for value.)", 6 VOUT (hiz) "Output.", 7 +VS (power) "Positive Supply Voltage.", 8 ~{DISABLE} (in) "Disable, Active Low."

## AD8021ARMZ-REEL
designator U?
Single Channel Low Power Operational Amplifier, 490 MHz BW, 120 V/us SR, Industrial, 8-pin SOP (RM-8), Reel; Generic Part Number: AD8021; Manufacturer: Analog Devices; PartNumber: AD8021ARMZ-REEL; Amplifiers Per Package: 1; Input Bias Current: 7.5uA; Input Offset Voltage: 400uV; Iq/Amp: 7.7mA; Small Signal Bandwidth: 490MHz; V Span Max: 24V; V Span Min: 4.5V; DatasheetVersion: Rev. F; PackageReference: RM-8; PackageDescription: 8-Pin Mini Small Outline Package, Body 3 x 3 mm, Pitch 0.65 mm; Supplier 1: Digi-Key; Supplier Part Number 1: AD8021ARMZ-REEL-ND; Supplier 2: Newark; Supplier Part Number 2: 59K6197; Slew Rate: 120V/us; Mounting Technology: Surface Mount; Code_JEDEC: MO-187-AA; ComponentLink1Description: Manufacturer URL; ComponentLink1URL: http://www.analog.com/en/index.html; ComponentLink2Description: Datasheet; ComponentLink2URL: http://www.analog.com/static/imported-files/data_sheets/AD8021.pdf; ComponentLink3Description: Package Specification; ComponentLink3URL: http://www.analog.com/static/imported-files/packages/PKG_PDF/MSOP%28RM%29/RM_8.pdf; ComponentLink4Description: Reference Circuit; ComponentLink4URL: http://www.analog.com/en/all-operational-amplifiers-op-amps/operational-amplifiers-op-amps/ad8021/products/product.html#product-recommendations
footprint ADI-RM-8_N (SOP, 8-Leads, Body 3x3mm, Pitch 0.65mm, IPC Medium Density)
footprint ADI-RM-8_L (SOP, 8-Leads, Body 3x3mm, Pitch 0.65mm, IPC High Density)
footprint ADI-RM-8_M (SOP, 8-Leads, Body 3x3mm, Pitch 0.65mm, IPC Low Density)
pins: 1 LOGIC REFERENCE "Reference for Pin 8 Voltage Level. Connect to logic low supply.", 2 -IN (in) "Inverting Input.", 3 +IN (in) "Noninverting Input.", 4 -VS (power) "Negative Supply Voltage.", 5 CCOMP "Compensation Capacitor. Tie to -VS. (See the Applications section for value.)", 6 VOUT (hiz) "Output.", 7 +VS (power) "Positive Supply Voltage.", 8 ~{DISABLE} (in) "Disable, Active Low."

## AD8021ARMZ-REEL7
designator U?
Single Channel Low Power Operational Amplifier, 490 MHz BW, 120 V/us SR, Industrial, 8-pin SOP (RM-8), Reel; Generic Part Number: AD8021; Manufacturer: Analog Devices; PartNumber: AD8021ARMZ-REEL7; Amplifiers Per Package: 1; Input Bias Current: 7.5uA; Input Offset Voltage: 400uV; Iq/Amp: 7.7mA; Small Signal Bandwidth: 490MHz; V Span Max: 24V; V Span Min: 4.5V; DatasheetVersion: Rev. F; PackageReference: RM-8; PackageDescription: 8-Pin Mini Small Outline Package, Body 3 x 3 mm, Pitch 0.65 mm; Supplier 1: Digi-Key; Supplier Part Number 1: AD8021ARMZ-REEL7-ND; Supplier 2: Newark; Supplier Part Number 2: 59K6198; Slew Rate: 120V/us; Mounting Technology: Surface Mount; Code_JEDEC: MO-187-AA; ComponentLink1Description: Manufacturer URL; ComponentLink1URL: http://www.analog.com/en/index.html; ComponentLink2Description: Datasheet; ComponentLink2URL: http://www.analog.com/static/imported-files/data_sheets/AD8021.pdf; ComponentLink3Description: Package Specification; ComponentLink3URL: http://www.analog.com/static/imported-files/packages/PKG_PDF/MSOP%28RM%29/RM_8.pdf; ComponentLink4Description: Reference Circuit; ComponentLink4URL: http://www.analog.com/en/all-operational-amplifiers-op-amps/operational-amplifiers-op-amps/ad8021/products/product.html#product-recommendations
footprint ADI-RM-8_N (SOP, 8-Leads, Body 3x3mm, Pitch 0.65mm, IPC Medium Density)
footprint ADI-RM-8_L (SOP, 8-Leads, Body 3x3mm, Pitch 0.65mm, IPC High Density)
footprint ADI-RM-8_M (SOP, 8-Leads, Body 3x3mm, Pitch 0.65mm, IPC Low Density)
pins: 1 LOGIC REFERENCE "Reference for Pin 8 Voltage Level. Connect to logic low supply.", 2 -IN (in) "Inverting Input.", 3 +IN (in) "Noninverting Input.", 4 -VS (power) "Negative Supply Voltage.", 5 CCOMP "Compensation Capacitor. Tie to -VS. (See the Applications section for value.)", 6 VOUT (hiz) "Output.", 7 +VS (power) "Positive Supply Voltage.", 8 ~{DISABLE} (in) "Disable, Active Low."

## AD8021ARZ
designator U?
Single Channel Low Power Operational Amplifier, 490 MHz BW, 120 V/us SR, Industrial, 8-pin SOIC (R-8), Tube; Generic Part Number: AD8021; Manufacturer: Analog Devices; PartNumber: AD8021ARZ; Amplifiers Per Package: 1; Input Bias Current: 7.5uA; Input Offset Voltage: 400uV; Iq/Amp: 7.7mA; Small Signal Bandwidth: 490MHz; V Span Max: 24V; V Span Min: 4.5V; DatasheetVersion: Rev. F; PackageVersion: 060506-A; PackageReference: R-8; PackageDescription: 8-Pin Standard Small Outline Package, Body 3.9 x 4.9 mm, Pitch 1.27 mm; Supplier 1: Digi-Key; Supplier Part Number 1: AD8021ARZ-ND; Supplier 2: Farnell; Supplier Part Number 2: 9426000; Supplier 3: Farnell; Supplier Part Number 3: 2133943; Supplier 4: Newark; Supplier Part Number 4: 88H0100; Slew Rate: 120V/us; Mounting Technology: Surface Mount; Code_JEDEC: MS-012-AA; ComponentLink1Description: Manufacturer URL; ComponentLink1URL: http://www.analog.com/en/index.html; ComponentLink2Description: Datasheet; ComponentLink2URL: http://www.analog.com/static/imported-files/data_sheets/AD8021.pdf; ComponentLink3Description: Package Specification; ComponentLink3URL: http://www.analog.com/static/imported-files/packages/PKG_PDF/SOIC_Narrow%20(R)/R_8.pdf; ComponentLink4Description: Reference Circuit; ComponentLink4URL: http://www.analog.com/en/all-operational-amplifiers-op-amps/operational-amplifiers-op-amps/ad8021/products/product.html#product-recommendations
footprint ADI-R-8_N (SOIC, 8-Leads, Body 4.9x3.9mm, Pitch 1.27mm, IPC Medium Density)
footprint ADI-R-8_L (SOIC, 8-Leads, Body 4.9x3.9mm, Pitch 1.27mm, IPC High Density)
footprint ADI-R-8_M (SOIC, 8-Leads, Body 4.9x3.9mm, Pitch 1.27mm, IPC Low Density)
pins: 1 LOGIC REFERENCE "Reference for Pin 81 Voltage Level. Connect to logic low supply.", 2 -IN (in) "Inverting Input.", 3 +IN (in) "Noninverting Input.", 4 -VS (power) "Negative Supply Voltage.", 5 CCOMP "Compensation Capacitor. Tie to -VS. (See the Applications section for value.)", 6 VOUT (out) "Output.", 7 +VS (power) "Positive Supply Voltage.", 8 ~{DISABLE} (in) "Disable, Active Low."

## AD8021ARZ-REEL
designator U?
Single Channel Low Power Operational Amplifier, 490 MHz BW, 120 V/us SR, Industrial, 8-pin SOIC (R-8), Reel; Generic Part Number: AD8021; Manufacturer: Analog Devices; PartNumber: AD8021ARZ-REEL; Amplifiers Per Package: 1; Input Bias Current: 7.5uA; Input Offset Voltage: 400uV; Iq/Amp: 7.7mA; Small Signal Bandwidth: 490MHz; V Span Max: 24V; V Span Min: 4.5V; DatasheetVersion: Rev. F; PackageVersion: 060506-A; PackageReference: R-8; PackageDescription: 8-Pin Standard Small Outline Package, Body 3.9 x 4.9 mm, Pitch 1.27 mm; Supplier 1: Digi-Key; Supplier Part Number 1: AD8021ARZ-REEL-ND; Supplier 2: Newark; Supplier Part Number 2: 88H0101; Slew Rate: 120V/us; Mounting Technology: Surface Mount; Code_JEDEC: MS-012-AA; ComponentLink1Description: Manufacturer URL; ComponentLink1URL: http://www.analog.com/en/index.html; ComponentLink2Description: Datasheet; ComponentLink2URL: http://www.analog.com/static/imported-files/data_sheets/AD8021.pdf; ComponentLink3Description: Package Specification; ComponentLink3URL: http://www.analog.com/static/imported-files/packages/PKG_PDF/SOIC_Narrow%20(R)/R_8.pdf; ComponentLink4Description: Reference Circuit; ComponentLink4URL: http://www.analog.com/en/all-operational-amplifiers-op-amps/operational-amplifiers-op-amps/ad8021/products/product.html#product-recommendations
footprint ADI-R-8_N (SOIC, 8-Leads, Body 4.9x3.9mm, Pitch 1.27mm, IPC Medium Density)
footprint ADI-R-8_L (SOIC, 8-Leads, Body 4.9x3.9mm, Pitch 1.27mm, IPC High Density)
footprint ADI-R-8_M (SOIC, 8-Leads, Body 4.9x3.9mm, Pitch 1.27mm, IPC Low Density)
pins: 1 LOGIC REFERENCE "Reference for Pin 81 Voltage Level. Connect to logic low supply.", 2 -IN (in) "Inverting Input.", 3 +IN (in) "Noninverting Input.", 4 -VS (power) "Negative Supply Voltage.", 5 CCOMP "Compensation Capacitor. Tie to -VS. (See the Applications section for value.)", 6 VOUT (out) "Output.", 7 +VS (power) "Positive Supply Voltage.", 8 ~{DISABLE} (in) "Disable, Active Low."

## AD8021ARZ-REEL7
designator U?
Single Channel Low Power Operational Amplifier, 490 MHz BW, 120 V/us SR, Industrial, 8-pin SOIC (R-8), Reel; Generic Part Number: AD8021; Manufacturer: Analog Devices; PartNumber: AD8021ARZ-REEL7; Amplifiers Per Package: 1; Input Bias Current: 7.5uA; Input Offset Voltage: 400uV; Iq/Amp: 7.7mA; Small Signal Bandwidth: 490MHz; V Span Max: 24V; V Span Min: 4.5V; DatasheetVersion: Rev. F; PackageVersion: 060506-A; PackageReference: R-8; PackageDescription: 8-Pin Standard Small Outline Package, Body 3.9 x 4.9 mm, Pitch 1.27 mm; Supplier 1: Digi-Key; Supplier Part Number 1: AD8021ARZ-REEL7TR-ND; Supplier 2: Digi-Key; Supplier Part Number 2: AD8021ARZ-REEL7CT-ND; Supplier 3: Digi-Key; Supplier Part Number 3: AD8021ARZ-REEL7DKR-ND; Supplier 4: Newark; Supplier Part Number 4: 82H2947; Slew Rate: 120V/us; Mounting Technology: Surface Mount; Code_JEDEC: MS-012-AA; ComponentLink1Description: Manufacturer URL; ComponentLink1URL: http://www.analog.com/en/index.html; ComponentLink2Description: Datasheet; ComponentLink2URL: http://www.analog.com/static/imported-files/data_sheets/AD8021.pdf; ComponentLink3Description: Package Specification; ComponentLink3URL: http://www.analog.com/static/imported-files/packages/PKG_PDF/SOIC_Narrow%20(R)/R_8.pdf; ComponentLink4Description: Reference Circuit; ComponentLink4URL: http://www.analog.com/en/all-operational-amplifiers-op-amps/operational-amplifiers-op-amps/ad8021/products/product.html#product-recommendations
footprint ADI-R-8_N (SOIC, 8-Leads, Body 4.9x3.9mm, Pitch 1.27mm, IPC Medium Density)
footprint ADI-R-8_L (SOIC, 8-Leads, Body 4.9x3.9mm, Pitch 1.27mm, IPC High Density)
footprint ADI-R-8_M (SOIC, 8-Leads, Body 4.9x3.9mm, Pitch 1.27mm, IPC Low Density)
pins: 1 LOGIC REFERENCE "Reference for Pin 81 Voltage Level. Connect to logic low supply.", 2 -IN (in) "Inverting Input.", 3 +IN (in) "Noninverting Input.", 4 -VS (power) "Negative Supply Voltage.", 5 CCOMP "Compensation Capacitor. Tie to -VS. (See the Applications section for value.)", 6 VOUT (out) "Output.", 7 +VS (power) "Positive Supply Voltage.", 8 ~{DISABLE} (in) "Disable, Active Low."

## AD8022AR
designator U?
Double Channel Low Power Operational Amplifier, 130 MHz BW, 50 V/us SR, Industrial, 8-pin SOIC (R-8), Tube; Generic Part Number: AD8022; Manufacturer: Analog Devices; PartNumber: AD8022AR; Amplifiers Per Package: 2; Input Bias Current: 2.5uA; Input Offset Voltage: 1.5mV; Iq/Amp: 5.5mA; Slew Rate: 50V/us; Small Signal Bandwidth: 130MHz; V Span Max: 26V; V Span Min: 4.5V; DatasheetVersion: Rev. C; PackageVersion: 060506-A; PackageReference: R-8; PackageDescription: 8-Pin Standard Small Outline Package, Body 3.9 x 4.9 mm, Pitch 1.27 mm; Supplier 1: Digi-Key; Supplier Part Number 1: AD8022AR-ND; Mounting Technology: Surface Mount; Code_JEDEC: MS-012-AA; ComponentLink1Description: Manufacturer URL; ComponentLink1URL: http://www.analog.com/en/index.html; ComponentLink2Description: Datasheet; ComponentLink2URL: http://www.analog.com/static/imported-files/data_sheets/AD8022.pdf; ComponentLink3Description: Package Specification; ComponentLink3URL: http://www.analog.com/static/imported-files/packages/PKG_PDF/SOIC_Narrow%20(R)/R_8.pdf; ComponentLink4Description: Reference Circuit; ComponentLink4URL: http://www.analog.com/en/all-operational-amplifiers-op-amps/operational-amplifiers-op-amps/ad8022/products/product.html#product-recommendations
footprint ADI-R-8_N (SOIC, 8-Leads, Body 4.9x3.9mm, Pitch 1.27mm, IPC Medium Density)
footprint ADI-R-8_L (SOIC, 8-Leads, Body 4.9x3.9mm, Pitch 1.27mm, IPC High Density)
footprint ADI-R-8_M (SOIC, 8-Leads, Body 4.9x3.9mm, Pitch 1.27mm, IPC Low Density)
pins on every part: 4 -VS (power), 8 +VS (power)
part A pins: 1 OUT 1 (out), 2 -IN 1 (in), 3 +IN 1 (in)
part B pins: 5 +IN 2 (in), 6 -IN 2 (in), 7 OUT 2 (out)

## AD8022ARMZ
designator U?
Double Channel Low Power Operational Amplifier, 130 MHz BW, 50 V/us SR, Industrial, 8-pin SOP (RM-8), Tube; Generic Part Number: AD8022; Manufacturer: Analog Devices; PartNumber: AD8022ARMZ; Amplifiers Per Package: 2; Input Bias Current: 2.5uA; Input Offset Voltage: 1.5mV; Iq/Amp: 5.5mA; Slew Rate: 50V/us; Small Signal Bandwidth: 130MHz; V Span Max: 26V; V Span Min: 4.5V; DatasheetVersion: Rev. C; PackageReference: RM-8; PackageDescription: 8-Pin Mini Small Outline Package, Body 3 x 3 mm, Pitch 0.65 mm; Supplier 1: Digi-Key; Supplier Part Number 1: AD8022ARMZ-ND; Supplier 2: Farnell; Supplier Part Number 2: 1699612; Supplier 3: Newark; Supplier Part Number 3: 59K6199; Mounting Technology: Surface Mount; Code_JEDEC: MO-187-AA; ComponentLink1Description: Manufacturer URL; ComponentLink1URL: http://www.analog.com/en/index.html; ComponentLink2Description: Datasheet; ComponentLink2URL: http://www.analog.com/static/imported-files/data_sheets/AD8022.pdf; ComponentLink3Description: Package Specification; ComponentLink3URL: http://www.analog.com/static/imported-files/packages/PKG_PDF/MSOP%28RM%29/RM_8.pdf; ComponentLink4Description: Reference Circuit; ComponentLink4URL: http://www.analog.com/en/all-operational-amplifiers-op-amps/operational-amplifiers-op-amps/ad8022/products/product.html#product-recommendations
footprint ADI-RM-8_N (SOP, 8-Leads, Body 3x3mm, Pitch 0.65mm, IPC Medium Density)
footprint ADI-RM-8_L (SOP, 8-Leads, Body 3x3mm, Pitch 0.65mm, IPC High Density)
footprint ADI-RM-8_M (SOP, 8-Leads, Body 3x3mm, Pitch 0.65mm, IPC Low Density)
pins on every part: 4 -VS (power), 8 +VS (power)
part A pins: 1 OUT 1 (out), 2 -IN 1 (in), 3 +IN 1 (in)
part B pins: 5 +IN 2 (in), 6 -IN 2 (in), 7 OUT 2 (out)

## AD8022ARMZ-REEL
designator U?
Double Channel Low Power Operational Amplifier, 130 MHz BW, 50 V/us SR, Industrial, 8-pin SOP (RM-8), Reel; Generic Part Number: AD8022; Manufacturer: Analog Devices; PartNumber: AD8022ARMZ-REEL; Amplifiers Per Package: 2; Input Bias Current: 2.5uA; Input Offset Voltage: 1.5mV; Iq/Amp: 5.5mA; Slew Rate: 50V/us; Small Signal Bandwidth: 130MHz; V Span Max: 26V; V Span Min: 4.5V; DatasheetVersion: Rev. C; PackageReference: RM-8; PackageDescription: 8-Pin Mini Small Outline Package, Body 3 x 3 mm, Pitch 0.65 mm; Supplier 1: Digi-Key; Supplier Part Number 1: AD8022ARMZ-REEL-ND; Mounting Technology: Surface Mount; Code_JEDEC: MO-187-AA; ComponentLink1Description: Manufacturer URL; ComponentLink1URL: http://www.analog.com/en/index.html; ComponentLink2Description: Datasheet; ComponentLink2URL: http://www.analog.com/static/imported-files/data_sheets/AD8022.pdf; ComponentLink3Description: Package Specification; ComponentLink3URL: http://www.analog.com/static/imported-files/packages/PKG_PDF/MSOP%28RM%29/RM_8.pdf; ComponentLink4Description: Reference Circuit; ComponentLink4URL: http://www.analog.com/en/all-operational-amplifiers-op-amps/operational-amplifiers-op-amps/ad8022/products/product.html#product-recommendations
footprint ADI-RM-8_N (SOP, 8-Leads, Body 3x3mm, Pitch 0.65mm, IPC Medium Density)
footprint ADI-RM-8_L (SOP, 8-Leads, Body 3x3mm, Pitch 0.65mm, IPC High Density)
footprint ADI-RM-8_M (SOP, 8-Leads, Body 3x3mm, Pitch 0.65mm, IPC Low Density)
pins on every part: 4 -VS (power), 8 +VS (power)
part A pins: 1 OUT 1 (out), 2 -IN 1 (in), 3 +IN 1 (in)
part B pins: 5 +IN 2 (in), 6 -IN 2 (in), 7 OUT 2 (out)

## AD8022ARMZ-REEL7
designator U?
Double Channel Low Power Operational Amplifier, 130 MHz BW, 50 V/us SR, Industrial, 8-pin SOP (RM-8), Reel; Generic Part Number: AD8022; Manufacturer: Analog Devices; PartNumber: AD8022ARMZ-REEL7; Amplifiers Per Package: 2; Input Bias Current: 2.5uA; Input Offset Voltage: 1.5mV; Iq/Amp: 5.5mA; Slew Rate: 50V/us; Small Signal Bandwidth: 130MHz; V Span Max: 26V; V Span Min: 4.5V; DatasheetVersion: Rev. C; PackageReference: RM-8; PackageDescription: 8-Pin Mini Small Outline Package, Body 3 x 3 mm, Pitch 0.65 mm; Supplier 1: Digi-Key; Supplier Part Number 1: AD8022ARMZ-REEL7TR-ND; Supplier 2: Digi-Key; Supplier Part Number 2: AD8022ARMZ-REEL7CT-ND; Supplier 3: Digi-Key; Supplier Part Number 3: AD8022ARMZ-REEL7DKR-ND; Supplier 4: Newark; Supplier Part Number 4: 59K6200; Mounting Technology: Surface Mount; Code_JEDEC: MO-187-AA; ComponentLink1Description: Manufacturer URL; ComponentLink1URL: http://www.analog.com/en/index.html; ComponentLink2Description: Datasheet; ComponentLink2URL: http://www.analog.com/static/imported-files/data_sheets/AD8022.pdf; ComponentLink3Description: Package Specification; ComponentLink3URL: http://www.analog.com/static/imported-files/packages/PKG_PDF/MSOP%28RM%29/RM_8.pdf; ComponentLink4Description: Reference Circuit; ComponentLink4URL: http://www.analog.com/en/all-operational-amplifiers-op-amps/operational-amplifiers-op-amps/ad8022/products/product.html#product-recommendations
footprint ADI-RM-8_N (SOP, 8-Leads, Body 3x3mm, Pitch 0.65mm, IPC Medium Density)
footprint ADI-RM-8_L (SOP, 8-Leads, Body 3x3mm, Pitch 0.65mm, IPC High Density)
footprint ADI-RM-8_M (SOP, 8-Leads, Body 3x3mm, Pitch 0.65mm, IPC Low Density)
pins on every part: 4 -VS (power), 8 +VS (power)
part A pins: 1 OUT 1 (out), 2 -IN 1 (in), 3 +IN 1 (in)
part B pins: 5 +IN 2 (in), 6 -IN 2 (in), 7 OUT 2 (out)